# Altium footprint library FxPcbLib.PcbLib: 112 footprints (part 4 of 7)
Each footprint in its own frame and in the unit in brackets; x right, y up, seen from the top. Pads: shape width x height; smd on the part's side, far side on the other; paste and mask are expansions set on the pad; w line width, h text height; cw(c..) or ccw(c..) is an arc to the next point about the centre after c.
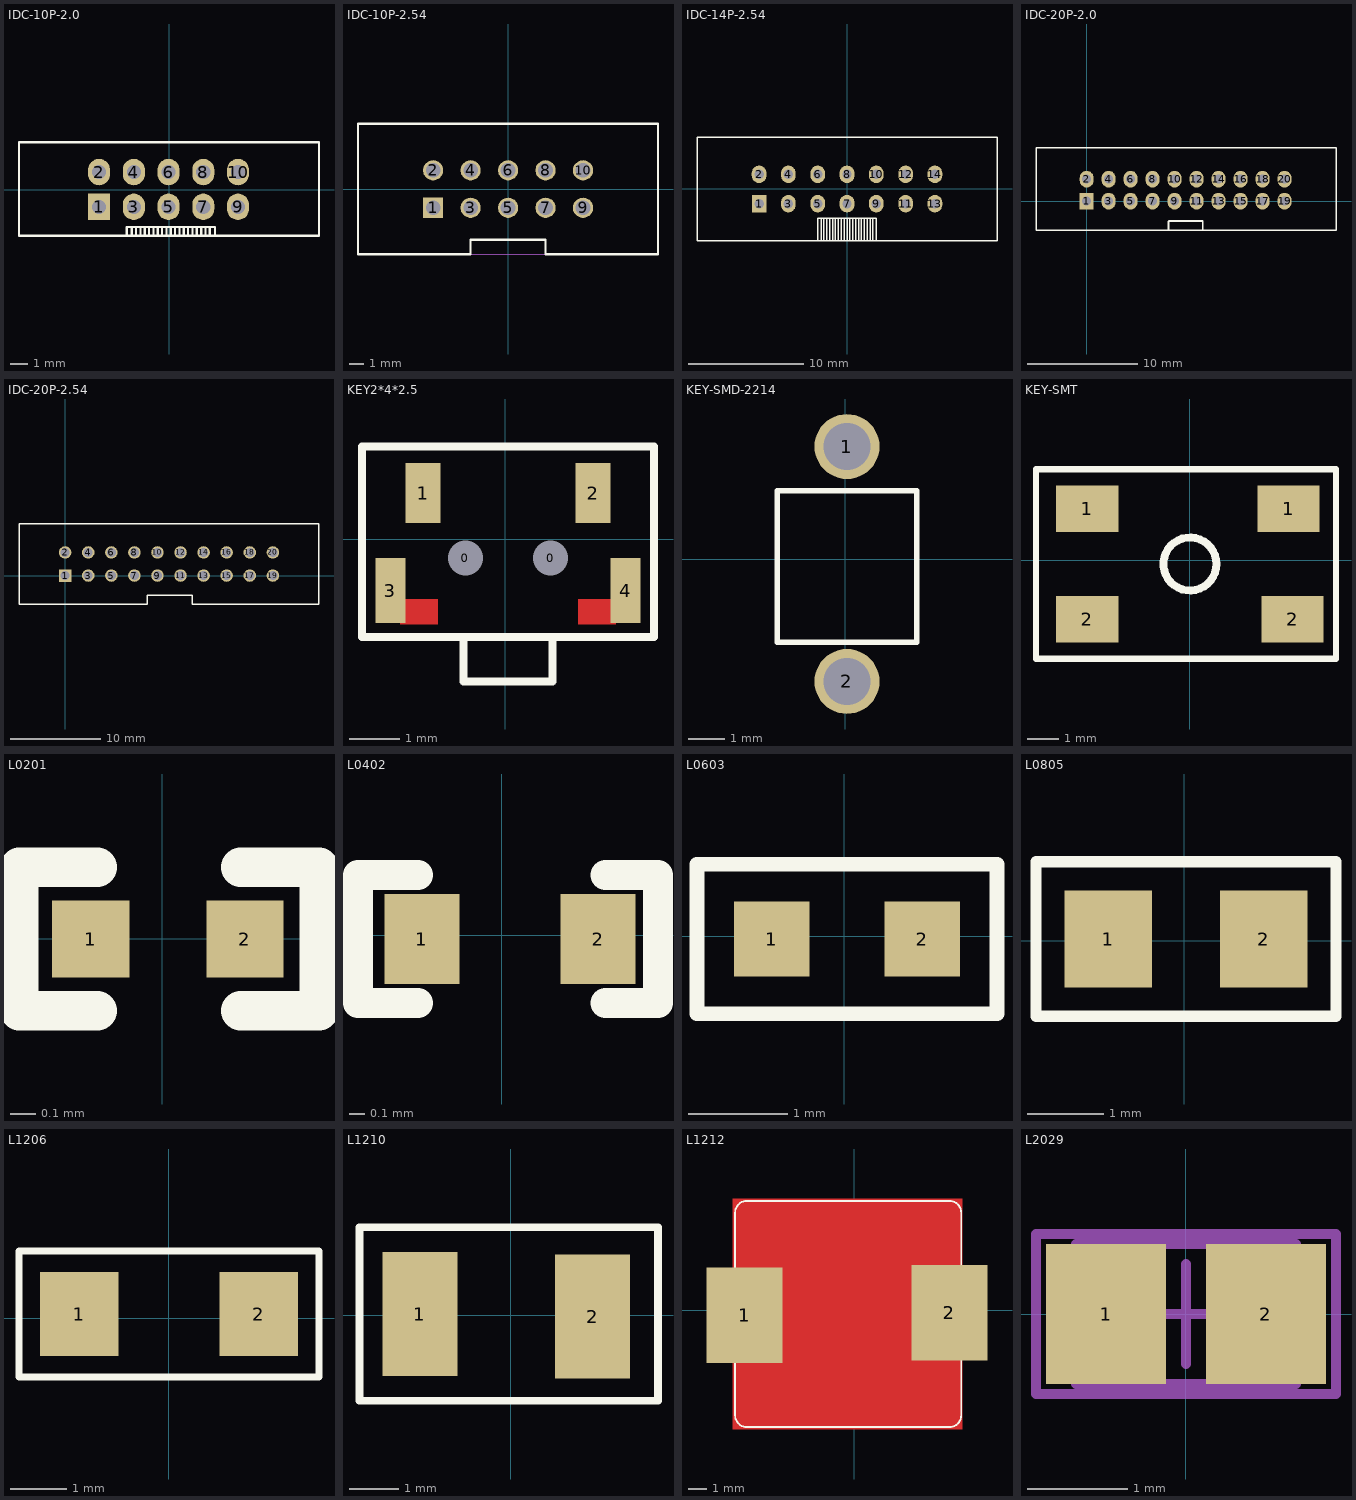
[diagram p3: the footprints below, top view; thin cyan lines are the x and y axes]

## IDC-10P-2.0 [mil]
pads (10):
  rect 50x60 hole 32: 1(-158.48,-38.37)
  oval 50x60 hole 32: 2(-158.48,40.37) 3(-79.74,-38.37) 4(-79.74,40.37) 5(-1,-38.37) 6(-1,40.37) 7(77.74,-38.37) 8(77.74,40.37) 9(156.48,-38.37) 10(156.48,40.37)
Top Overlay:
  lines w5: -96,-102.43 -96,-84.32 104,-84.32 104,-102.43 ; -84.58,-102.43 -84.58,-84.32 ; -74.74,-102.43 -74.74,-84.32 ; -64.9,-102.43 -64.9,-84.32 ; -55.05,-102.43 -55.05,-84.32 ; -45.21,-102.43 -45.21,-84.32 ; -35.37,-102.43 -35.37,-84.32 ; -25.53,-102.43 -25.53,-84.32 ; -15.68,-102.43 -15.68,-84.32 ; -5.84,-102.43 -5.84,-84.32 ; 4,-102.43 4,-84.32 ; 13.84,-102.43 13.84,-84.32 ; 23.69,-102.43 23.69,-84.32 ; 33.53,-102.43 33.53,-84.32 ; 43.37,-102.43 43.37,-84.32 ; 53.21,-102.43 53.21,-84.32 ; 63.06,-102.43 63.06,-84.32 ; 72.9,-102.43 72.9,-84.32 ; 82.74,-102.43 82.74,-84.32 ; 92.58,-102.43 92.58,-84.32 ; -340,-104 -340,108 340,108 340,-104 -340,-104
3D body: height 222.44, standoff -141.73, extent -335.65,-106.57 333.65,108

## IDC-10P-2.54 [mil]
pads (10):
  rect 54x54 / inner round 60 / far side rect 54x54 hole 39: 1(-200,-50)
  round 54 / inner round 60 / far side round 54 hole 39: 2(-200,50) 3(-100,-50) 4(-100,50) 5(0,-50) 6(0,50) 7(100,-50) 8(100,50) 9(200,-50) 10(200,50)
Top Overlay:
  lines w6: -400,-174 -100,-174 -100,-135 100,-135 100,-174 400,-174 400,174 -400,174 -400,-174
Mechanical 8:
  text "1" at -200,-60 h25
  text "9" at 200,-60 h25
  text "3" at -100,-60 h25
  text "5" at 0,-60 h25
  text "4" at -100,40 h25
  text "2" at -200,40 h25
  text "8" at 100,40 h25
  text "7" at 100,-60 h25
  text "6" at 0,40 h25
Mechanical 9:
  lines w1: -400.3,174.6 -400,-173.4 -400.2,-174.1 350,-174 399.5,-174.2 399.5,173.6 350,174 -400.3,174.6
3D body: height 366.14, standoff -122.05, extent -399.6,-178.22 399.61,180.05

## IDC-14P-2.54 [mil]
pads (14):
  rect 50x60 hole 32: 1(-300,-50)
  oval 50x60 hole 32: 2(-300,50) 3(-200,-50) 4(-200,50) 5(-100,-50) 6(-100,50) 7(0,-50) 8(0,50) 9(100,-50) 10(100,50) 11(200,-50) 12(200,50) 13(300,-50) 14(300,50)
Top Overlay:
  lines w5: -100,-177.17 -100,-100 100,-100 100,-177.17 ; -88.58,-177.17 -88.58,-100 ; -78.74,-177.17 -78.74,-100 ; -68.9,-177.17 -68.9,-100 ; -59.05,-177.17 -59.05,-100 ; -49.21,-177.17 -49.21,-100 ; -39.37,-177.17 -39.37,-100 ; -29.53,-177.17 -29.53,-100 ; -19.68,-177.17 -19.68,-100 ; -9.84,-177.17 -9.84,-100 ; 0,-177.17 0,-100 ; 9.84,-177.17 9.84,-100 ; 19.69,-177.17 19.69,-100 ; 29.53,-177.17 29.53,-100 ; 39.37,-177.17 39.37,-100 ; 49.21,-177.17 49.21,-100 ; 59.06,-177.17 59.06,-100 ; 68.9,-177.17 68.9,-100 ; 78.74,-177.17 78.74,-100 ; 88.58,-177.17 88.58,-100 ; -511.81,-177.17 511.81,-177.17 511.81,177.17 -511.81,177.17 -511.81,-177.17
3D body: height 339.76, standoff -148.43, extent -499.6,-176.32 499.61,172.1

## IDC-20P-2.0 [mil]
pads (20):
  rect 50x60 hole 32: 1(0,0)
  oval 50x60 hole 32: 2(0,78.74) 3(78.74,0) 4(78.74,78.74) 5(157.48,0) 6(157.48,78.74) 7(236.22,0) 8(236.22,78.74) 9(314.96,0) 10(314.96,78.74) 11(393.7,0) 12(393.7,78.74) 13(472.44,0) 14(472.44,78.74) 15(551.18,0) 16(551.18,78.74) 17(629.92,0) 18(629.92,78.74) 19(708.66,0) 20(708.66,78.74)
Top Overlay:
  lines w5: -181.52,-104 -181.52,191 893,191 893,-104 -181.52,-104
  lines w6: 293,-104 293,-73 295,-71 416,-71 416,-104
3D body: height 303.15, standoff 0, extent -177.47,-106.28 889.47,189

## IDC-20P-2.54 [mil]
pads (20):
  rect 54x54 / inner round 60 / far side rect 54x54 hole 39: 1(0,0)
  round 54 / inner round 60 / far side round 54 hole 39: 2(0,100) 3(100,0) 4(100,100) 5(200,0) 6(200,100) 7(300,0) 8(300,100) 9(400,0) 10(400,100) 11(500,0) 12(500,100) 13(600,0) 14(600,100) 15(700,0) 16(700,100) 17(800,0) 18(800,100) 19(900,0) 20(900,100)
Top Overlay:
  lines w6: -200,-124 -200,224 1100,224 1100,-124 550,-124 550,-85 355,-85 355,-124 -200,-124
Mechanical 8:
  text "6" at 200,90 h25
  text "7" at 300,-10 h25
  text "8" at 300,90 h25
  text "2" at 0,90 h25
  text "4" at 100,90 h25
  text "5" at 200,-10 h25
  text "3" at 100,-10 h25
  text "9" at 400,-10 h25
  text "1" at 0,-10 h25
3D body: height 359.45, standoff -128.74, extent -199.61,-124.99 1099.6,223.43

## KEY2*4*2.5 [mm]
pads (6):
  round 0.3 hole 0.7 paste+0 mask+0.15: 0(-0.799,-0.376) 0(0.901,-0.376)
  rect 0.7x1.2 smd paste+0 mask+0.15: 1(-1.649,0.924) 2(1.751,0.924)
  rect 0.6x1.3 smd paste+0 mask+0.15: 3(-2.299,-1.026) 4(2.401,-1.026)
Top Layer:
  rectangle: -2.108,-1.702 -1.346,-1.194
  rectangle: 1.448,-1.702 2.21,-1.194
Top Overlay:
  lines w0.152: -0.838,-1.956 -0.838,-2.845 0.94,-2.845 0.94,-1.956 ; -2.87,-1.956 -2.87,1.854 2.972,1.854 2.972,-1.956 -2.87,-1.956
Top Solder:
  rectangle: -2.108,-1.829 -1.219,-1.067
  rectangle: 1.321,-1.829 2.21,-1.067

## KEY-SMD-2214 [mm]
pads (2):
  round 1.8 hole 1.3 mask+0.025: 1(0.051,3.123) 2(0.051,-3.377)
Top Overlay:
  lines w0.152: -1.874,-2.286 1.976,-2.286 1.976,1.905 -1.874,1.905 -1.874,-2.286
3D body: height 2.5, standoff 0, extent -1.797,-4.145 1.903,3.855

## KEY-SMT [mm]
pads (4):
  rect 2x1.5 smd: 1(-3.302,1.651) 1(3.175,1.651) 2(-3.302,-1.905) 2(3.302,-1.905)
Top Overlay:
  circle w0.254: c0,-0.127 r0.852
  lines w0.2: -4.953,-3.175 -4.953,2.921 4.699,2.921 4.699,-3.175 -4.953,-3.175
3D body: height 1.5, standoff 0, extent -3.2,-2.794 3.2,2.506

## L0201 [mm]
pads (2):
  rect 0.3x0.3 smd: 1(-0.279,0) 2(0.321,0)
Top Overlay:
  lines w0.152: -0.254,-0.279 -0.559,-0.279 -0.559,0.279 -0.254,0.279 ; 0.305,-0.279 0.61,-0.279 0.61,0.279 0.305,0.279
3D body: height 0.34, standoff 0, extent -0.314,-0.165 0.366,0.165

## L0402 [mm]
pads (2):
  rect 0.5x0.6 smd: 1(-0.533,-0.025) 2(0.642,-0.025)
Top Overlay:
  lines w0.2: -0.558,-0.45 -0.958,-0.45 -0.958,0.4 -0.558,0.4 ; 0.692,-0.45 1.042,-0.45 1.042,0.4 0.692,0.4
3D body: height 0.34, standoff 0, extent -0.453,-0.325 0.587,0.275

## L0603 [mil]
pads (2):
  rect 30x30 smd: 1(-29,-1) 2(31,-1)
Top Overlay:
  lines w5.91: -58.76,-30.76 60.76,-30.76 60.76,28.76 -58.76,28.76 -58.76,-30.76
3D body: height 17.72, standoff 0, extent -30.5,-17.5 32.5,14

## L0805 [mil]
pads (2):
  rect 45x50 smd: 1(-39,1) 2(41,1)
Top Overlay:
  lines w5.91: -76.26,-38.76 -76.26,40.76 78.26,40.76 78.26,-38.76 -76.26,-38.76
3D body: height 21.65, standoff 0, extent -37.66,-24.71 41.08,24.9

## L1206 [mm]
pads (2):
  rect 1.4x1.5 smd: 1(-1.6,0.076) 2(1.6,0.076)
Top Overlay:
  lines w0.127: -2.675,-1.049 2.675,-1.049 2.675,1.201 -2.675,1.201 -2.675,-1.049
3D body: height 0.6, standoff 0, extent -1.625,-0.698 1.575,0.902

## L1210 [mm]
pads (2):
  rect 1.52x2.5 smd: 1(-1.829,0.025) 2(1.652,-0.025)
Top Overlay:
  lines w0.152: -3.048,-1.727 2.972,-1.727 2.972,1.778 -3.048,1.778 -3.048,-1.727
3D body: height 0.6, standoff 0, extent -1.701,-1.25 1.499,1.25

## L1212 [mil]
pads (2):
  rect 160x200 smd: 1(-230,-10) 2(200,-5)
Top Layer:
  pour cut-out: -255,235 -255,-250 227,-250 227,235
Top Overlay:
  lines w4: -250,-220 ccw(c-225,-220) -225,-245 200,-245 ccw(c200,-220) 225,-220 225,205 ccw(c200,205) 200,230 -225,230 ccw(c-225,205) -250,205 -250,-145 -250,-220
3D body: height 295.28, standoff -19.68, extent -259.06,-254.13 233.06,238

## L2029 [mm]
pads (2):
  rect 1.2x1.4 smd: 1(-0.8,0) 2(0.8,0)
Mechanical 13:
  lines w0.1: -1.1,-0.7 -1.1,0.7 1.1,0.7 1.1,-0.7 -1.1,-0.7
Mechanical 15:
  lines w0.1: -0.5,0 0.5,0 ; 0,-0.5 0,0.5 ; -1.5,-0.8 -1.5,0.8 1.5,0.8 1.5,-0.8 -1.5,-0.8
3D body: height 0.55, standoff 0, extent -1.1,-0.7 1.1,0.7